# Altium footprint library CONN_HDR_MINI_ST_SMD.PcbLib: 102 footprints (part 2 of 7)
Each footprint in its own frame and in the unit in brackets; x right, y up, seen from the top. Pads: shape width x height; smd on the part's side, far side on the other; paste and mask are expansions set on the pad; w line width, h text height; cw(c..) or ccw(c..) is an arc to the next point about the centre after c.
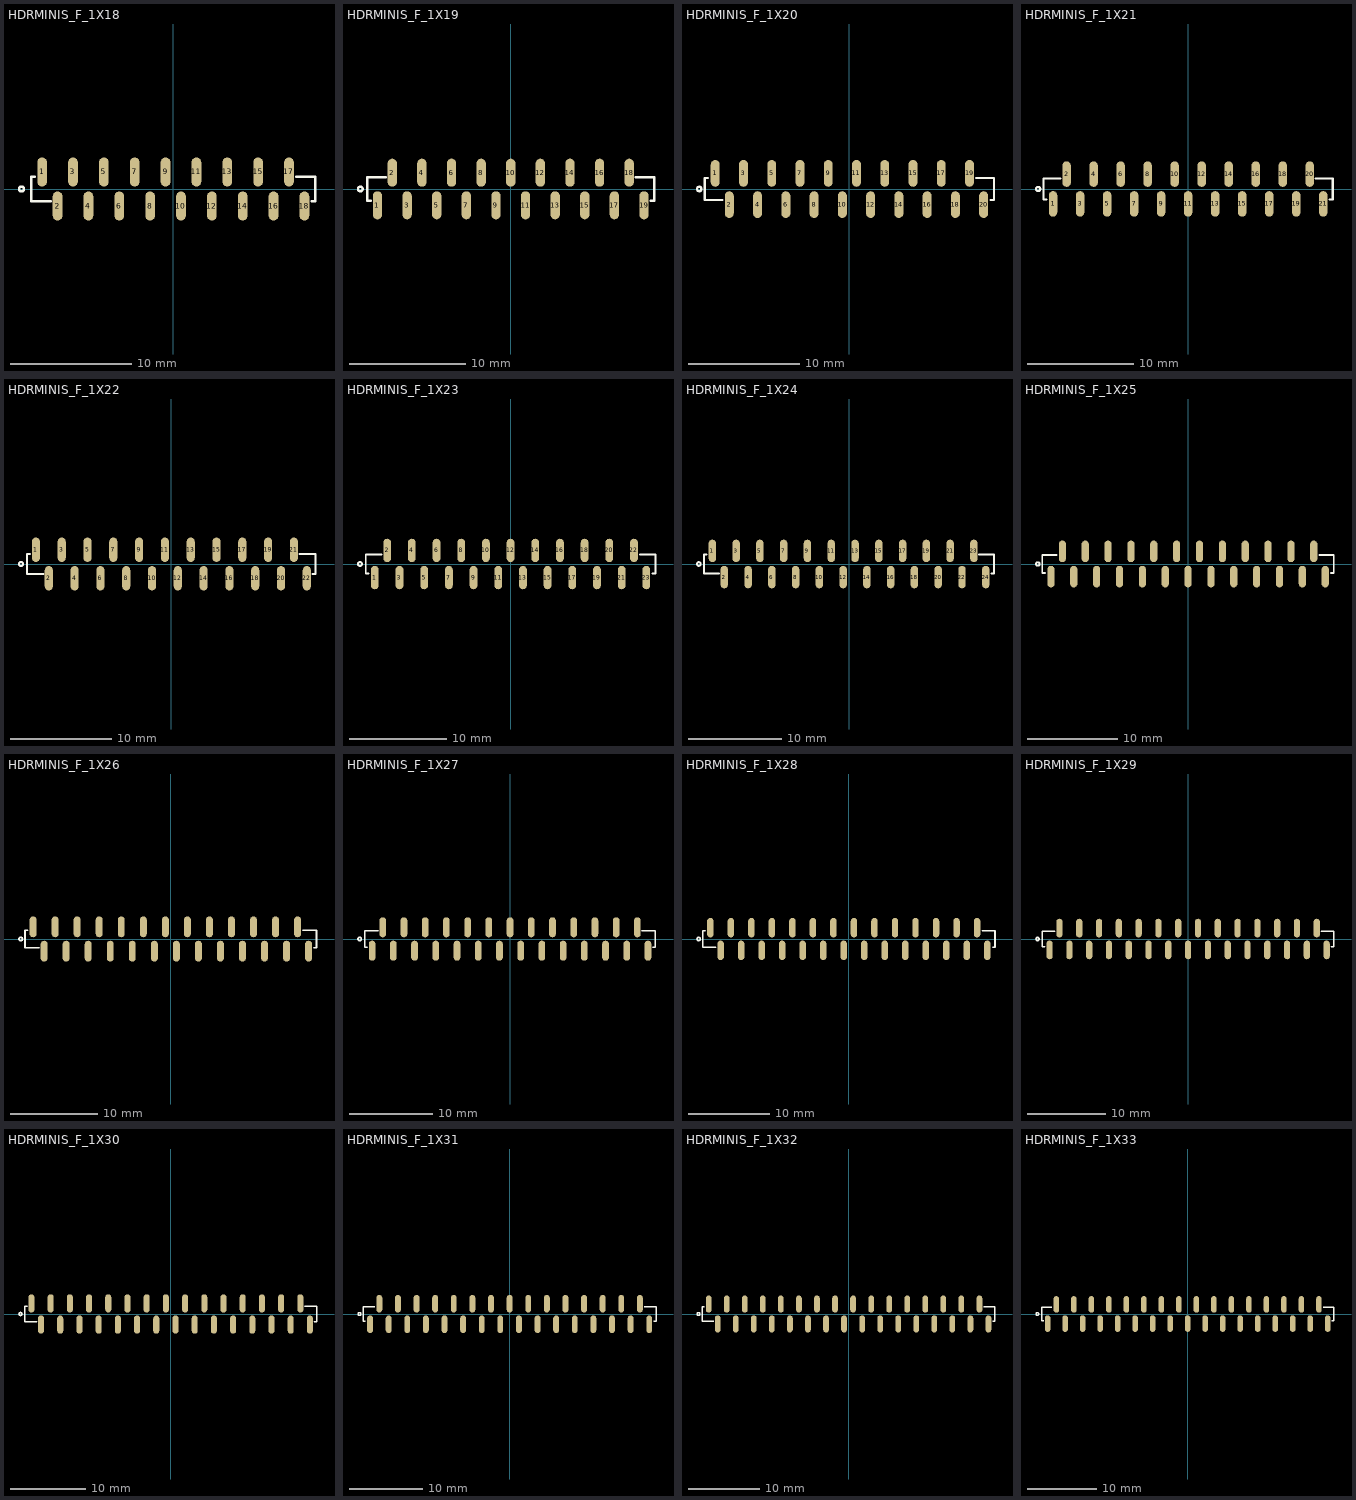
[diagram p1: the footprints below, top view; thin cyan lines are the x and y axes]

## HDRMINIS_F_1X18 [mm] "mini header (50mil pitch)"
pads (18):
  oval 0.8x2.4 smd mask+0.1: 1(-10.795,1.4) 2(-9.525,-1.4) 3(-8.255,1.4) 4(-6.985,-1.4) 5(-5.715,1.4) 6(-4.445,-1.4) 7(-3.175,1.4) 8(-1.905,-1.4) 9(-0.635,1.4) 10(0.635,-1.4) 11(1.905,1.4) 12(3.175,-1.4) 13(4.445,1.4) 14(5.715,-1.4) 15(6.985,1.4) 16(8.255,-1.4) 17(9.525,1.4) 18(10.795,-1.4)
Top Overlay:
  circle w0.2: c-12.5,0 r0.2
  lines w0.2: -11.4,1 -11.7,1 -11.7,-1 -10.1,-1 ; 10.1,1 11.7,1 11.7,-1 11.4,-1
3D body "a-bl127-eg-z02mr1.step": height 4.65, standoff 0.05, extent 3.61,-1.6 6.55,1.6
3D body "a-bl127-eg-z02mr1.step": height 4.65, standoff 0.05, extent 6.15,-1.6 9.09,1.6
3D body "a-bl127-eg-z02mr1.step": height 4.65, standoff 0.05, extent 8.69,-1.6 11.63,1.6
3D body "a-bl127-eg-z02mr1.step": height 4.65, standoff 0.05, extent 1.07,-1.6 4.01,1.6
3D body "a-bl127-eg-z02mr1.step": height 4.65, standoff 0.05, extent -1.47,-1.6 1.47,1.6
3D body "a-bl127-eg-z02mr1.step": height 4.65, standoff 0.05, extent -4.01,-1.6 -1.07,1.6
3D body "a-bl127-eg-z02mr1.step": height 4.65, standoff 0.05, extent -6.55,-1.6 -3.61,1.6
3D body "a-bl127-eg-z02mr1.step": height 4.65, standoff 0.05, extent -9.09,-1.6 -6.15,1.6
3D body "a-bl127-eg-z02mr1.step": height 4.65, standoff 0.05, extent -11.63,-1.6 -8.69,1.6

## HDRMINIS_F_1X19 [mm] "mini header (50mil pitch)"
pads (19):
  oval 0.8x2.4 smd mask+0.1: 1(-11.43,-1.4) 2(-10.16,1.4) 3(-8.89,-1.4) 4(-7.62,1.4) 5(-6.35,-1.4) 6(-5.08,1.4) 7(-3.81,-1.4) 8(-2.54,1.4) 9(-1.27,-1.4) 10(0,1.4) 11(1.27,-1.4) 12(2.54,1.4) 13(3.81,-1.4) 14(5.08,1.4) 15(6.35,-1.4) 16(7.62,1.4) 17(8.89,-1.4) 18(10.16,1.4) 19(11.43,-1.4)
Top Overlay:
  circle w0.2: c-12.9,0 r0.2
  lines w0.2: -12,-1 -12.3,-1 -12.3,1 -10.7,1 ; 10.7,1 12.3,1 12.3,-1 12,-1
3D body "a-bl127-eg-z02mr1.step": height 4.65, standoff 0.05, extent 6.785,-1.6 9.725,1.6
3D body "a-bl127-eg-z02mr1.step": height 4.65, standoff 0.05, extent 9.325,-1.6 12.265,1.6
3D body "a-bl127-eg-z02mr1.step": height 4.65, standoff 0.05, extent 4.245,-1.6 7.185,1.6
3D body "a-bl127-eg-z02mr1.step": height 4.65, standoff 0.05, extent 1.705,-1.6 4.645,1.6
3D body "a-bl127-eg-z02mr1.step": height 4.65, standoff 0.05, extent -0.835,-1.6 2.105,1.6
3D body "a-bl127-eg-z02mr1.step": height 4.65, standoff 0.05, extent -3.375,-1.6 -0.435,1.6
3D body "a-bl127-eg-z02mr1.step": height 4.65, standoff 0.05, extent -5.915,-1.6 -2.975,1.6
3D body "a-bl127-eg-z02mr1.step": height 4.65, standoff 0.05, extent -8.455,-1.6 -5.515,1.6
3D body "a-bl127-eg-z03mr1.stp": height 4.65, standoff 0.05, extent -12.265,-1.6 -8.055,1.6

## HDRMINIS_F_1X20 [mm] "mini header (50mil pitch)"
pads (20):
  oval 0.8x2.4 smd mask+0.1: 1(-12.065,1.4) 2(-10.795,-1.4) 3(-9.525,1.4) 4(-8.255,-1.4) 5(-6.985,1.4) 6(-5.715,-1.4) 7(-4.445,1.4) 8(-3.175,-1.4) 9(-1.905,1.4) 10(-0.635,-1.4) 11(0.635,1.4) 12(1.905,-1.4) 13(3.175,1.4) 14(4.445,-1.4) 15(5.715,1.4) 16(6.985,-1.4) 17(8.255,1.4) 18(9.525,-1.4) 19(10.795,1.4) 20(12.065,-1.4)
Top Overlay:
  circle w0.2: c-13.5,0 r0.2
  lines w0.2: -12.7,1 -13,1 -13,-1 -11.4,-1 ; 11.4,1 13,1 13,-1 12.7,-1
3D body "a-bl127-eg-z02mr1.step": height 4.65, standoff 0.05, extent -12.9,-1.6 -9.96,1.6
3D body "a-bl127-eg-z02mr1.step": height 4.65, standoff 0.05, extent -10.36,-1.6 -7.42,1.6
3D body "a-bl127-eg-z02mr1.step": height 4.65, standoff 0.05, extent -7.82,-1.6 -4.88,1.6
3D body "a-bl127-eg-z02mr1.step": height 4.65, standoff 0.05, extent -5.28,-1.6 -2.34,1.6
3D body "a-bl127-eg-z02mr1.step": height 4.65, standoff 0.05, extent -2.74,-1.6 0.2,1.6
3D body "a-bl127-eg-z02mr1.step": height 4.65, standoff 0.05, extent -0.2,-1.6 2.74,1.6
3D body "a-bl127-eg-z02mr1.step": height 4.65, standoff 0.05, extent 9.96,-1.6 12.9,1.6
3D body "a-bl127-eg-z02mr1.step": height 4.65, standoff 0.05, extent 7.42,-1.6 10.36,1.6
3D body "a-bl127-eg-z02mr1.step": height 4.65, standoff 0.05, extent 4.88,-1.6 7.82,1.6
3D body "a-bl127-eg-z02mr1.step": height 4.65, standoff 0.05, extent 2.34,-1.6 5.28,1.6

## HDRMINIS_F_1X21 [mm] "mini header (50mil pitch)"
pads (21):
  oval 0.8x2.4 smd mask+0.1: 1(-12.7,-1.4) 2(-11.43,1.4) 3(-10.16,-1.4) 4(-8.89,1.4) 5(-7.62,-1.4) 6(-6.35,1.4) 7(-5.08,-1.4) 8(-3.81,1.4) 9(-2.54,-1.4) 10(-1.27,1.4) 11(0,-1.4) 12(1.27,1.4) 13(2.54,-1.4) 14(3.81,1.4) 15(5.08,-1.4) 16(6.35,1.4) 17(7.62,-1.4) 18(8.89,1.4) 19(10.16,-1.4) 20(11.43,1.4) 21(12.7,-1.4)
Top Overlay:
  circle w0.2: c-14.1,0 r0.2
  lines w0.2: -13.3,-1 -13.6,-1 -13.6,1 -12,1 ; 12,1 13.6,1 13.6,-1 13.3,-1
3D body "a-bl127-eg-z03mr1.stp": height 4.65, standoff 0.05, extent -13.535,-1.6 -9.325,1.6
3D body "a-bl127-eg-z02mr1.step": height 4.65, standoff 0.05, extent -9.725,-1.6 -6.785,1.6
3D body "a-bl127-eg-z02mr1.step": height 4.65, standoff 0.05, extent -7.185,-1.6 -4.245,1.6
3D body "a-bl127-eg-z02mr1.step": height 4.65, standoff 0.05, extent -4.645,-1.6 -1.705,1.6
3D body "a-bl127-eg-z02mr1.step": height 4.65, standoff 0.05, extent -2.105,-1.6 0.835,1.6
3D body "a-bl127-eg-z02mr1.step": height 4.65, standoff 0.05, extent 0.435,-1.6 3.375,1.6
3D body "a-bl127-eg-z02mr1.step": height 4.65, standoff 0.05, extent 2.975,-1.6 5.915,1.6
3D body "a-bl127-eg-z02mr1.step": height 4.65, standoff 0.05, extent 10.595,-1.6 13.535,1.6
3D body "a-bl127-eg-z02mr1.step": height 4.65, standoff 0.05, extent 8.055,-1.6 10.995,1.6
3D body "a-bl127-eg-z02mr1.step": height 4.65, standoff 0.05, extent 5.515,-1.6 8.455,1.6

## HDRMINIS_F_1X22 [mm] "mini header (50mil pitch)"
pads (22):
  oval 0.8x2.4 smd mask+0.1: 1(-13.335,1.4) 2(-12.065,-1.4) 3(-10.795,1.4) 4(-9.525,-1.4) 5(-8.255,1.4) 6(-6.985,-1.4) 7(-5.715,1.4) 8(-4.445,-1.4) 9(-3.175,1.4) 10(-1.905,-1.4) 11(-0.635,1.4) 12(0.635,-1.4) 13(1.905,1.4) 14(3.175,-1.4) 15(4.445,1.4) 16(5.715,-1.4) 17(6.985,1.4) 18(8.255,-1.4) 19(9.525,1.4) 20(10.795,-1.4) 21(12.065,1.4) 22(13.335,-1.4)
Top Overlay:
  circle w0.2: c-14.8,0 r0.2
  lines w0.2: -13.9,1 -14.2,1 -14.2,-1 -12.6,-1 ; 12.6,1 14.2,1 14.2,-1 13.9,-1
3D body "a-bl127-eg-z02mr1.step": height 4.65, standoff 0.05, extent -14.17,-1.6 -11.23,1.6
3D body "a-bl127-eg-z02mr1.step": height 4.65, standoff 0.05, extent -11.63,-1.6 -8.69,1.6
3D body "a-bl127-eg-z02mr1.step": height 4.65, standoff 0.05, extent -9.09,-1.6 -6.15,1.6
3D body "a-bl127-eg-z02mr1.step": height 4.65, standoff 0.05, extent -6.55,-1.6 -3.61,1.6
3D body "a-bl127-eg-z02mr1.step": height 4.65, standoff 0.05, extent -4.01,-1.6 -1.07,1.6
3D body "a-bl127-eg-z02mr1.step": height 4.65, standoff 0.05, extent -1.47,-1.6 1.47,1.6
3D body "a-bl127-eg-z02mr1.step": height 4.65, standoff 0.05, extent 8.69,-1.6 11.63,1.6
3D body "a-bl127-eg-z02mr1.step": height 4.65, standoff 0.05, extent 6.15,-1.6 9.09,1.6
3D body "a-bl127-eg-z02mr1.step": height 4.65, standoff 0.05, extent 3.61,-1.6 6.55,1.6
3D body "a-bl127-eg-z02mr1.step": height 4.65, standoff 0.05, extent 1.07,-1.6 4.01,1.6
3D body "a-bl127-eg-z02mr1.step": height 4.65, standoff 0.05, extent 11.23,-1.6 14.17,1.6

## HDRMINIS_F_1X23 [mm] "mini header (50mil pitch)"
pads (23):
  oval 0.8x2.4 smd mask+0.1: 1(-13.97,-1.4) 2(-12.7,1.4) 3(-11.43,-1.4) 4(-10.16,1.4) 5(-8.89,-1.4) 6(-7.62,1.4) 7(-6.35,-1.4) 8(-5.08,1.4) 9(-3.81,-1.4) 10(-2.54,1.4) 11(-1.27,-1.4) 12(0,1.4) 13(1.27,-1.4) 14(2.54,1.4) 15(3.81,-1.4) 16(5.08,1.4) 17(6.35,-1.4) 18(7.62,1.4) 19(8.89,-1.4) 20(10.16,1.4) 21(11.43,-1.4) 22(12.7,1.4) 23(13.97,-1.4)
Top Overlay:
  circle w0.2: c-15.5,0 r0.2
  lines w0.2: -14.6,-1 -14.9,-1 -14.9,1 -13.3,1 ; 13.3,1 14.9,1 14.9,-1 14.6,-1
3D body "a-bl127-eg-z03mr1.stp": height 4.65, standoff 0.05, extent -14.805,-1.6 -10.595,1.6
3D body "a-bl127-eg-z02mr1.step": height 4.65, standoff 0.05, extent -10.995,-1.6 -8.055,1.6
3D body "a-bl127-eg-z02mr1.step": height 4.65, standoff 0.05, extent -8.455,-1.6 -5.515,1.6
3D body "a-bl127-eg-z02mr1.step": height 4.65, standoff 0.05, extent -5.915,-1.6 -2.975,1.6
3D body "a-bl127-eg-z02mr1.step": height 4.65, standoff 0.05, extent -3.375,-1.6 -0.435,1.6
3D body "a-bl127-eg-z02mr1.step": height 4.65, standoff 0.05, extent -0.835,-1.6 2.105,1.6
3D body "a-bl127-eg-z02mr1.step": height 4.65, standoff 0.05, extent 1.705,-1.6 4.645,1.6
3D body "a-bl127-eg-z02mr1.step": height 4.65, standoff 0.05, extent 11.865,-1.6 14.805,1.6
3D body "a-bl127-eg-z02mr1.step": height 4.65, standoff 0.05, extent 9.325,-1.6 12.265,1.6
3D body "a-bl127-eg-z02mr1.step": height 4.65, standoff 0.05, extent 6.785,-1.6 9.725,1.6
3D body "a-bl127-eg-z02mr1.step": height 4.65, standoff 0.05, extent 4.245,-1.6 7.185,1.6

## HDRMINIS_F_1X24 [mm] "mini header (50mil pitch)"
pads (24):
  oval 0.8x2.4 smd mask+0.1: 1(-14.605,1.4) 2(-13.335,-1.4) 3(-12.065,1.4) 4(-10.795,-1.4) 5(-9.525,1.4) 6(-8.255,-1.4) 7(-6.985,1.4) 8(-5.715,-1.4) 9(-4.445,1.4) 10(-3.175,-1.4) 11(-1.905,1.4) 12(-0.635,-1.4) 13(0.635,1.4) 14(1.905,-1.4) 15(3.175,1.4) 16(4.445,-1.4) 17(5.715,1.4) 18(6.985,-1.4) 19(8.255,1.4) 20(9.525,-1.4) 21(10.795,1.4) 22(12.065,-1.4) 23(13.335,1.4) 24(14.605,-1.4)
Top Overlay:
  circle w0.2: c-16.048,0 r0.2
  lines w0.2: -15.2,1 -15.5,1 -15.5,-1 -13.9,-1 ; 13.9,1 15.5,1 15.5,-1 15.2,-1
3D body "a-bl127-eg-z02mr1.step": height 4.65, standoff 0.05, extent 9.96,-1.6 12.9,1.6
3D body "a-bl127-eg-z02mr1.step": height 4.65, standoff 0.05, extent 12.5,-1.6 15.44,1.6
3D body "a-bl127-eg-z02mr1.step": height 4.65, standoff 0.05, extent -0.2,-1.6 2.74,1.6
3D body "a-bl127-eg-z02mr1.step": height 4.65, standoff 0.05, extent 2.34,-1.6 5.28,1.6
3D body "a-bl127-eg-z02mr1.step": height 4.65, standoff 0.05, extent 4.88,-1.6 7.82,1.6
3D body "a-bl127-eg-z02mr1.step": height 4.65, standoff 0.05, extent 7.42,-1.6 10.36,1.6
3D body "a-bl127-eg-z02mr1.step": height 4.65, standoff 0.05, extent -2.74,-1.6 0.2,1.6
3D body "a-bl127-eg-z02mr1.step": height 4.65, standoff 0.05, extent -5.28,-1.6 -2.34,1.6
3D body "a-bl127-eg-z02mr1.step": height 4.65, standoff 0.05, extent -7.82,-1.6 -4.88,1.6
3D body "a-bl127-eg-z02mr1.step": height 4.65, standoff 0.05, extent -10.36,-1.6 -7.42,1.6
3D body "a-bl127-eg-z02mr1.step": height 4.65, standoff 0.05, extent -12.9,-1.6 -9.96,1.6
3D body "a-bl127-eg-z02mr1.step": height 4.65, standoff 0.05, extent -15.44,-1.6 -12.5,1.6

## HDRMINIS_F_1X25 [mm] "mini header (50mil pitch)"
pads (25):
  oval 0.8x2.4 smd mask+0.1: 1(-15.24,-1.4) 2(-13.97,1.4) 3(-12.7,-1.4) 4(-11.43,1.4) 5(-10.16,-1.4) 6(-8.89,1.4) 7(-7.62,-1.4) 8(-6.35,1.4) 9(-5.08,-1.4) 10(-3.81,1.4) 11(-2.54,-1.4) 12(-1.27,1.4) 13(0,-1.4) 14(1.27,1.4) 15(2.54,-1.4) 16(3.81,1.4) 17(5.08,-1.4) 18(6.35,1.4) 19(7.62,-1.4) 20(8.89,1.4) 21(10.16,-1.4) 22(11.43,1.4) 23(12.7,-1.4) 24(13.97,1.4) 25(15.24,-1.4)
Top Overlay:
  circle w0.2: c-16.7,0 r0.2
  lines w0.2: -15.9,-1 -16.2,-1 -16.2,1 -14.6,1 ; 14.6,1 16.2,1 16.2,-1 15.9,-1
3D body "a-bl127-eg-z03mr1.stp": height 4.65, standoff 0.05, extent -16.075,-1.6 -11.865,1.6
3D body "a-bl127-eg-z02mr1.step": height 4.65, standoff 0.05, extent -12.265,-1.6 -9.325,1.6
3D body "a-bl127-eg-z02mr1.step": height 4.65, standoff 0.05, extent -9.725,-1.6 -6.785,1.6
3D body "a-bl127-eg-z02mr1.step": height 4.65, standoff 0.05, extent -7.185,-1.6 -4.245,1.6
3D body "a-bl127-eg-z02mr1.step": height 4.65, standoff 0.05, extent -4.645,-1.6 -1.705,1.6
3D body "a-bl127-eg-z02mr1.step": height 4.65, standoff 0.05, extent -2.105,-1.6 0.835,1.6
3D body "a-bl127-eg-z02mr1.step": height 4.65, standoff 0.05, extent 0.435,-1.6 3.375,1.6
3D body "a-bl127-eg-z02mr1.step": height 4.65, standoff 0.05, extent 10.595,-1.6 13.535,1.6
3D body "a-bl127-eg-z02mr1.step": height 4.65, standoff 0.05, extent 8.055,-1.6 10.995,1.6
3D body "a-bl127-eg-z02mr1.step": height 4.65, standoff 0.05, extent 5.515,-1.6 8.455,1.6
3D body "a-bl127-eg-z02mr1.step": height 4.65, standoff 0.05, extent 2.975,-1.6 5.915,1.6
3D body "a-bl127-eg-z02mr1.step": height 4.65, standoff 0.05, extent 13.135,-1.6 16.075,1.6

## HDRMINIS_F_1X26 [mm] "mini header (50mil pitch)"
pads (26):
  oval 0.8x2.4 smd mask+0.1: 1(-15.875,1.4) 2(-14.605,-1.4) 3(-13.335,1.4) 4(-12.065,-1.4) 5(-10.795,1.4) 6(-9.525,-1.4) 7(-8.255,1.4) 8(-6.985,-1.4) 9(-5.715,1.4) 10(-4.445,-1.4) 11(-3.175,1.4) 12(-1.905,-1.4) 13(-0.635,1.4) 14(0.635,-1.4) 15(1.905,1.4) 16(3.175,-1.4) 17(4.445,1.4) 18(5.715,-1.4) 19(6.985,1.4) 20(8.255,-1.4) 21(9.525,1.4) 22(10.795,-1.4) 23(12.065,1.4) 24(13.335,-1.4) 25(14.605,1.4) 26(15.875,-1.4)
Top Overlay:
  circle w0.2: c-17.3,0 r0.2
  lines w0.2: -16.5,1 -16.8,1 -16.8,-1 -15.2,-1 ; 15.2,1 16.8,1 16.8,-1 16.5,-1
3D body "a-bl127-eg-z02mr1.step": height 4.65, standoff 0.05, extent 8.69,-1.6 11.63,1.6
3D body "a-bl127-eg-z02mr1.step": height 4.65, standoff 0.05, extent 11.23,-1.6 14.17,1.6
3D body "a-bl127-eg-z02mr1.step": height 4.65, standoff 0.05, extent 13.77,-1.6 16.71,1.6
3D body "a-bl127-eg-z02mr1.step": height 4.65, standoff 0.05, extent -1.47,-1.6 1.47,1.6
3D body "a-bl127-eg-z02mr1.step": height 4.65, standoff 0.05, extent 1.07,-1.6 4.01,1.6
3D body "a-bl127-eg-z02mr1.step": height 4.65, standoff 0.05, extent 3.61,-1.6 6.55,1.6
3D body "a-bl127-eg-z02mr1.step": height 4.65, standoff 0.05, extent 6.15,-1.6 9.09,1.6
3D body "a-bl127-eg-z02mr1.step": height 4.65, standoff 0.05, extent -4.01,-1.6 -1.07,1.6
3D body "a-bl127-eg-z02mr1.step": height 4.65, standoff 0.05, extent -6.55,-1.6 -3.61,1.6
3D body "a-bl127-eg-z02mr1.step": height 4.65, standoff 0.05, extent -9.09,-1.6 -6.15,1.6
3D body "a-bl127-eg-z02mr1.step": height 4.65, standoff 0.05, extent -11.63,-1.6 -8.69,1.6
3D body "a-bl127-eg-z02mr1.step": height 4.65, standoff 0.05, extent -14.17,-1.6 -11.23,1.6
3D body "a-bl127-eg-z02mr1.step": height 4.65, standoff 0.05, extent -16.71,-1.6 -13.77,1.6

## HDRMINIS_F_1X27 [mm] "mini header (50mil pitch)"
pads (27):
  oval 0.8x2.4 smd mask+0.1: 1(-16.51,-1.4) 2(-15.24,1.4) 3(-13.97,-1.4) 4(-12.7,1.4) 5(-11.43,-1.4) 6(-10.16,1.4) 7(-8.89,-1.4) 8(-7.62,1.4) 9(-6.35,-1.4) 10(-5.08,1.4) 11(-3.81,-1.4) 12(-2.54,1.4) 13(-1.27,-1.4) 14(0,1.4) 15(1.27,-1.4) 16(2.54,1.4) 17(3.81,-1.4) 18(5.08,1.4) 19(6.35,-1.4) 20(7.62,1.4) 21(8.89,-1.4) 22(10.16,1.4) 23(11.43,-1.4) 24(12.7,1.4) 25(13.97,-1.4) 26(15.24,1.4) 27(16.51,-1.4)
Top Overlay:
  circle w0.2: c-18,0 r0.2
  lines w0.2: -17.1,-1 -17.4,-1 -17.4,1 -15.8,1 ; 15.8,1 17.4,1 17.4,-1 17.1,-1
3D body "a-bl127-eg-z02mr1.step": height 4.65, standoff 0.05, extent 11.865,-1.6 14.805,1.6
3D body "a-bl127-eg-z02mr1.step": height 4.65, standoff 0.05, extent 14.405,-1.6 17.345,1.6
3D body "a-bl127-eg-z02mr1.step": height 4.65, standoff 0.05, extent 1.705,-1.6 4.645,1.6
3D body "a-bl127-eg-z02mr1.step": height 4.65, standoff 0.05, extent 4.245,-1.6 7.185,1.6
3D body "a-bl127-eg-z02mr1.step": height 4.65, standoff 0.05, extent 6.785,-1.6 9.725,1.6
3D body "a-bl127-eg-z02mr1.step": height 4.65, standoff 0.05, extent 9.325,-1.6 12.265,1.6
3D body "a-bl127-eg-z02mr1.step": height 4.65, standoff 0.05, extent -0.835,-1.6 2.105,1.6
3D body "a-bl127-eg-z02mr1.step": height 4.65, standoff 0.05, extent -3.375,-1.6 -0.435,1.6
3D body "a-bl127-eg-z02mr1.step": height 4.65, standoff 0.05, extent -5.915,-1.6 -2.975,1.6
3D body "a-bl127-eg-z02mr1.step": height 4.65, standoff 0.05, extent -8.455,-1.6 -5.515,1.6
3D body "a-bl127-eg-z02mr1.step": height 4.65, standoff 0.05, extent -10.995,-1.6 -8.055,1.6
3D body "a-bl127-eg-z02mr1.step": height 4.65, standoff 0.05, extent -13.535,-1.6 -10.595,1.6
3D body "a-bl127-eg-z03mr1.stp": height 4.65, standoff 0.05, extent -17.345,-1.6 -13.135,1.6

## HDRMINIS_F_1X28 [mm] "mini header (50mil pitch)"
pads (28):
  oval 0.8x2.4 smd mask+0.1: 1(-17.145,1.4) 2(-15.875,-1.4) 3(-14.605,1.4) 4(-13.335,-1.4) 5(-12.065,1.4) 6(-10.795,-1.4) 7(-9.525,1.4) 8(-8.255,-1.4) 9(-6.985,1.4) 10(-5.715,-1.4) 11(-4.445,1.4) 12(-3.175,-1.4) 13(-1.905,1.4) 14(-0.635,-1.4) 15(0.635,1.4) 16(1.905,-1.4) 17(3.175,1.4) 18(4.445,-1.4) 19(5.715,1.4) 20(6.985,-1.4) 21(8.255,1.4) 22(9.525,-1.4) 23(10.795,1.4) 24(12.065,-1.4) 25(13.335,1.4) 26(14.605,-1.4) 27(15.875,1.4) 28(17.145,-1.4)
Top Overlay:
  circle w0.2: c-18.6,0 r0.2
  lines w0.2: -17.8,1 -18.1,1 -18.1,-1 -16.5,-1 ; 16.5,1 18.1,1 18.1,-1 17.8,-1
3D body "a-bl127-eg-z02mr1.step": height 4.65, standoff 0.05, extent -17.98,-1.6 -15.04,1.6
3D body "a-bl127-eg-z02mr1.step": height 4.65, standoff 0.05, extent -15.44,-1.6 -12.5,1.6
3D body "a-bl127-eg-z02mr1.step": height 4.65, standoff 0.05, extent -12.9,-1.6 -9.96,1.6
3D body "a-bl127-eg-z02mr1.step": height 4.65, standoff 0.05, extent -10.36,-1.6 -7.42,1.6
3D body "a-bl127-eg-z02mr1.step": height 4.65, standoff 0.05, extent -7.82,-1.6 -4.88,1.6
3D body "a-bl127-eg-z02mr1.step": height 4.65, standoff 0.05, extent -5.28,-1.6 -2.34,1.6
3D body "a-bl127-eg-z02mr1.step": height 4.65, standoff 0.05, extent 4.88,-1.6 7.82,1.6
3D body "a-bl127-eg-z02mr1.step": height 4.65, standoff 0.05, extent 2.34,-1.6 5.28,1.6
3D body "a-bl127-eg-z02mr1.step": height 4.65, standoff 0.05, extent -0.2,-1.6 2.74,1.6
3D body "a-bl127-eg-z02mr1.step": height 4.65, standoff 0.05, extent -2.74,-1.6 0.2,1.6
3D body "a-bl127-eg-z02mr1.step": height 4.65, standoff 0.05, extent 15.04,-1.6 17.98,1.6
3D body "a-bl127-eg-z02mr1.step": height 4.65, standoff 0.05, extent 12.5,-1.6 15.44,1.6
3D body "a-bl127-eg-z02mr1.step": height 4.65, standoff 0.05, extent 9.96,-1.6 12.9,1.6
3D body "a-bl127-eg-z02mr1.step": height 4.65, standoff 0.05, extent 7.42,-1.6 10.36,1.6

## HDRMINIS_F_1X29 [mm] "mini header (50mil pitch)"
pads (29):
  oval 0.8x2.4 smd mask+0.1: 1(-17.78,-1.4) 2(-16.51,1.4) 3(-15.24,-1.4) 4(-13.97,1.4) 5(-12.7,-1.4) 6(-11.43,1.4) 7(-10.16,-1.4) 8(-8.89,1.4) 9(-7.62,-1.4) 10(-6.35,1.4) 11(-5.08,-1.4) 12(-3.81,1.4) 13(-2.54,-1.4) 14(-1.27,1.4) 15(0,-1.4) 16(1.27,1.4) 17(2.54,-1.4) 18(3.81,1.4) 19(5.08,-1.4) 20(6.35,1.4) 21(7.62,-1.4) 22(8.89,1.4) 23(10.16,-1.4) 24(11.43,1.4) 25(12.7,-1.4) 26(13.97,1.4) 27(15.24,-1.4) 28(16.51,1.4) 29(17.78,-1.4)
Top Overlay:
  circle w0.2: c-19.323,0 r0.2
  lines w0.2: -18.4,-1 -18.7,-1 -18.7,1 -17.1,1 ; 17.1,1 18.7,1 18.7,-1 18.4,-1
3D body "a-bl127-eg-z03mr1.stp": height 4.65, standoff 0.05, extent -18.615,-1.6 -14.405,1.6
3D body "a-bl127-eg-z02mr1.step": height 4.65, standoff 0.05, extent -14.805,-1.6 -11.865,1.6
3D body "a-bl127-eg-z02mr1.step": height 4.65, standoff 0.05, extent -12.265,-1.6 -9.325,1.6
3D body "a-bl127-eg-z02mr1.step": height 4.65, standoff 0.05, extent -9.725,-1.6 -6.785,1.6
3D body "a-bl127-eg-z02mr1.step": height 4.65, standoff 0.05, extent -7.185,-1.6 -4.245,1.6
3D body "a-bl127-eg-z02mr1.step": height 4.65, standoff 0.05, extent -4.645,-1.6 -1.705,1.6
3D body "a-bl127-eg-z02mr1.step": height 4.65, standoff 0.05, extent -2.105,-1.6 0.835,1.6
3D body "a-bl127-eg-z02mr1.step": height 4.65, standoff 0.05, extent 8.055,-1.6 10.995,1.6
3D body "a-bl127-eg-z02mr1.step": height 4.65, standoff 0.05, extent 5.515,-1.6 8.455,1.6
3D body "a-bl127-eg-z02mr1.step": height 4.65, standoff 0.05, extent 2.975,-1.6 5.915,1.6
3D body "a-bl127-eg-z02mr1.step": height 4.65, standoff 0.05, extent 0.435,-1.6 3.375,1.6
3D body "a-bl127-eg-z02mr1.step": height 4.65, standoff 0.05, extent 15.675,-1.6 18.615,1.6
3D body "a-bl127-eg-z02mr1.step": height 4.65, standoff 0.05, extent 13.135,-1.6 16.075,1.6
3D body "a-bl127-eg-z02mr1.step": height 4.65, standoff 0.05, extent 10.595,-1.6 13.535,1.6

## HDRMINIS_F_1X30 [mm] "mini header (50mil pitch)"
pads (30):
  oval 0.8x2.4 smd mask+0.1: 1(-18.415,1.4) 2(-17.145,-1.4) 3(-15.875,1.4) 4(-14.605,-1.4) 5(-13.335,1.4) 6(-12.065,-1.4) 7(-10.795,1.4) 8(-9.525,-1.4) 9(-8.255,1.4) 10(-6.985,-1.4) 11(-5.715,1.4) 12(-4.445,-1.4) 13(-3.175,1.4) 14(-1.905,-1.4) 15(-0.635,1.4) 16(0.635,-1.4) 17(1.905,1.4) 18(3.175,-1.4) 19(4.445,1.4) 20(5.715,-1.4) 21(6.985,1.4) 22(8.255,-1.4) 23(9.525,1.4) 24(10.795,-1.4) 25(12.065,1.4) 26(13.335,-1.4) 27(14.605,1.4) 28(15.875,-1.4) 29(17.145,1.4) 30(18.415,-1.4)
Top Overlay:
  circle w0.2: c-19.858,0 r0.2
  lines w0.2: -19,1 -19.3,1 -19.3,-1 -17.7,-1 ; 17.7,1 19.3,1 19.3,-1 19,-1
3D body "a-bl127-eg-z02mr1.step": height 4.65, standoff 0.05, extent 6.15,-1.6 9.09,1.6
3D body "a-bl127-eg-z02mr1.step": height 4.65, standoff 0.05, extent 8.69,-1.6 11.63,1.6
3D body "a-bl127-eg-z02mr1.step": height 4.65, standoff 0.05, extent 11.23,-1.6 14.17,1.6
3D body "a-bl127-eg-z02mr1.step": height 4.65, standoff 0.05, extent 13.77,-1.6 16.71,1.6
3D body "a-bl127-eg-z02mr1.step": height 4.65, standoff 0.05, extent 16.31,-1.6 19.25,1.6
3D body "a-bl127-eg-z02mr1.step": height 4.65, standoff 0.05, extent -4.01,-1.6 -1.07,1.6
3D body "a-bl127-eg-z02mr1.step": height 4.65, standoff 0.05, extent -1.47,-1.6 1.47,1.6
3D body "a-bl127-eg-z02mr1.step": height 4.65, standoff 0.05, extent 1.07,-1.6 4.01,1.6
3D body "a-bl127-eg-z02mr1.step": height 4.65, standoff 0.05, extent 3.61,-1.6 6.55,1.6
3D body "a-bl127-eg-z02mr1.step": height 4.65, standoff 0.05, extent -6.55,-1.6 -3.61,1.6
3D body "a-bl127-eg-z02mr1.step": height 4.65, standoff 0.05, extent -9.09,-1.6 -6.15,1.6
3D body "a-bl127-eg-z02mr1.step": height 4.65, standoff 0.05, extent -11.63,-1.6 -8.69,1.6
3D body "a-bl127-eg-z02mr1.step": height 4.65, standoff 0.05, extent -14.17,-1.6 -11.23,1.6
3D body "a-bl127-eg-z02mr1.step": height 4.65, standoff 0.05, extent -16.71,-1.6 -13.77,1.6
3D body "a-bl127-eg-z02mr1.step": height 4.65, standoff 0.05, extent -19.25,-1.6 -16.31,1.6

## HDRMINIS_F_1X31 [mm] "mini header (50mil pitch)"
pads (31):
  oval 0.8x2.4 smd mask+0.1: 1(-19.05,-1.4) 2(-17.78,1.4) 3(-16.51,-1.4) 4(-15.24,1.4) 5(-13.97,-1.4) 6(-12.7,1.4) 7(-11.43,-1.4) 8(-10.16,1.4) 9(-8.89,-1.4) 10(-7.62,1.4) 11(-6.35,-1.4) 12(-5.08,1.4) 13(-3.81,-1.4) 14(-2.54,1.4) 15(-1.27,-1.4) 16(0,1.4) 17(1.27,-1.4) 18(2.54,1.4) 19(3.81,-1.4) 20(5.08,1.4) 21(6.35,-1.4) 22(7.62,1.4) 23(8.89,-1.4) 24(10.16,1.4) 25(11.43,-1.4) 26(12.7,1.4) 27(13.97,-1.4) 28(15.24,1.4) 29(16.51,-1.4) 30(17.78,1.4) 31(19.05,-1.4)
Top Overlay:
  circle w0.2: c-20.493,0 r0.2
  lines w0.2: -19.7,-1 -20,-1 -20,1 -18.4,1 ; 18.4,1 20,1 20,-1 19.7,-1
3D body "a-bl127-eg-z03mr1.stp": height 4.65, standoff 0.05, extent -19.885,-1.6 -15.675,1.6
3D body "a-bl127-eg-z02mr1.step": height 4.65, standoff 0.05, extent -16.075,-1.6 -13.135,1.6
3D body "a-bl127-eg-z02mr1.step": height 4.65, standoff 0.05, extent -13.535,-1.6 -10.595,1.6
3D body "a-bl127-eg-z02mr1.step": height 4.65, standoff 0.05, extent -10.995,-1.6 -8.055,1.6
3D body "a-bl127-eg-z02mr1.step": height 4.65, standoff 0.05, extent -8.455,-1.6 -5.515,1.6
3D body "a-bl127-eg-z02mr1.step": height 4.65, standoff 0.05, extent -5.915,-1.6 -2.975,1.6
3D body "a-bl127-eg-z02mr1.step": height 4.65, standoff 0.05, extent -3.375,-1.6 -0.435,1.6
3D body "a-bl127-eg-z02mr1.step": height 4.65, standoff 0.05, extent 6.785,-1.6 9.725,1.6
3D body "a-bl127-eg-z02mr1.step": height 4.65, standoff 0.05, extent 4.245,-1.6 7.185,1.6
3D body "a-bl127-eg-z02mr1.step": height 4.65, standoff 0.05, extent 1.705,-1.6 4.645,1.6
3D body "a-bl127-eg-z02mr1.step": height 4.65, standoff 0.05, extent -0.835,-1.6 2.105,1.6
3D body "a-bl127-eg-z02mr1.step": height 4.65, standoff 0.05, extent 16.945,-1.6 19.885,1.6
3D body "a-bl127-eg-z02mr1.step": height 4.65, standoff 0.05, extent 14.405,-1.6 17.345,1.6
3D body "a-bl127-eg-z02mr1.step": height 4.65, standoff 0.05, extent 11.865,-1.6 14.805,1.6
3D body "a-bl127-eg-z02mr1.step": height 4.65, standoff 0.05, extent 9.325,-1.6 12.265,1.6

## HDRMINIS_F_1X32 [mm] "mini header (50mil pitch)"
pads (32):
  oval 0.8x2.4 smd mask+0.1: 1(-19.685,1.4) 2(-18.415,-1.4) 3(-17.145,1.4) 4(-15.875,-1.4) 5(-14.605,1.4) 6(-13.335,-1.4) 7(-12.065,1.4) 8(-10.795,-1.4) 9(-9.525,1.4) 10(-8.255,-1.4) 11(-6.985,1.4) 12(-5.715,-1.4) 13(-4.445,1.4) 14(-3.175,-1.4) 15(-1.905,1.4) 16(-0.635,-1.4) 17(0.635,1.4) 18(1.905,-1.4) 19(3.175,1.4) 20(4.445,-1.4) 21(5.715,1.4) 22(6.985,-1.4) 23(8.255,1.4) 24(9.525,-1.4) 25(10.795,1.4) 26(12.065,-1.4) 27(13.335,1.4) 28(14.605,-1.4) 29(15.875,1.4) 30(17.145,-1.4) 31(18.415,1.4) 32(19.685,-1.4)
Top Overlay:
  circle w0.2: c-21.128,0 r0.2
  lines w0.2: -20.3,1 -20.6,1 -20.6,-1 -19,-1 ; 19,1 20.6,1 20.6,-1 20.3,-1
3D body "a-bl127-eg-z02mr1.step": height 4.65, standoff 0.05, extent -20.52,-1.6 -17.58,1.6
3D body "a-bl127-eg-z02mr1.step": height 4.65, standoff 0.05, extent -17.98,-1.6 -15.04,1.6
3D body "a-bl127-eg-z02mr1.step": height 4.65, standoff 0.05, extent -15.44,-1.6 -12.5,1.6
3D body "a-bl127-eg-z02mr1.step": height 4.65, standoff 0.05, extent -12.9,-1.6 -9.96,1.6
3D body "a-bl127-eg-z02mr1.step": height 4.65, standoff 0.05, extent -10.36,-1.6 -7.42,1.6
3D body "a-bl127-eg-z02mr1.step": height 4.65, standoff 0.05, extent -7.82,-1.6 -4.88,1.6
3D body "a-bl127-eg-z02mr1.step": height 4.65, standoff 0.05, extent 2.34,-1.6 5.28,1.6
3D body "a-bl127-eg-z02mr1.step": height 4.65, standoff 0.05, extent -0.2,-1.6 2.74,1.6
3D body "a-bl127-eg-z02mr1.step": height 4.65, standoff 0.05, extent -2.74,-1.6 0.2,1.6
3D body "a-bl127-eg-z02mr1.step": height 4.65, standoff 0.05, extent -5.28,-1.6 -2.34,1.6
3D body "a-bl127-eg-z02mr1.step": height 4.65, standoff 0.05, extent 17.58,-1.6 20.52,1.6
3D body "a-bl127-eg-z02mr1.step": height 4.65, standoff 0.05, extent 15.04,-1.6 17.98,1.6
3D body "a-bl127-eg-z02mr1.step": height 4.65, standoff 0.05, extent 12.5,-1.6 15.44,1.6
3D body "a-bl127-eg-z02mr1.step": height 4.65, standoff 0.05, extent 9.96,-1.6 12.9,1.6
3D body "a-bl127-eg-z02mr1.step": height 4.65, standoff 0.05, extent 7.42,-1.6 10.36,1.6
3D body "a-bl127-eg-z02mr1.step": height 4.65, standoff 0.05, extent 4.88,-1.6 7.82,1.6

## HDRMINIS_F_1X33 [mm] "mini header (50mil pitch)"
pads (33):
  oval 0.8x2.4 smd mask+0.1: 1(-20.32,-1.4) 2(-19.05,1.4) 3(-17.78,-1.4) 4(-16.51,1.4) 5(-15.24,-1.4) 6(-13.97,1.4) 7(-12.7,-1.4) 8(-11.43,1.4) 9(-10.16,-1.4) 10(-8.89,1.4) 11(-7.62,-1.4) 12(-6.35,1.4) 13(-5.08,-1.4) 14(-3.81,1.4) 15(-2.54,-1.4) 16(-1.27,1.4) 17(0,-1.4) 18(1.27,1.4) 19(2.54,-1.4) 20(3.81,1.4) 21(5.08,-1.4) 22(6.35,1.4) 23(7.62,-1.4) 24(8.89,1.4) 25(10.16,-1.4) 26(11.43,1.4) 27(12.7,-1.4) 28(13.97,1.4) 29(15.24,-1.4) 30(16.51,1.4) 31(17.78,-1.4) 32(19.05,1.4) 33(20.32,-1.4)
Top Overlay:
  circle w0.2: c-21.8,0 r0.2
  lines w0.2: -20.9,-1 -21.2,-1 -21.2,1 -19.7,1 ; 19.7,1 21.2,1 21.2,-1 20.9,-1
3D body "a-bl127-eg-z02mr1.step": height 4.65, standoff 0.05, extent 8.055,-1.6 10.995,1.6
3D body "a-bl127-eg-z02mr1.step": height 4.65, standoff 0.05, extent 10.595,-1.6 13.535,1.6
3D body "a-bl127-eg-z02mr1.step": height 4.65, standoff 0.05, extent 13.135,-1.6 16.075,1.6
3D body "a-bl127-eg-z02mr1.step": height 4.65, standoff 0.05, extent 15.675,-1.6 18.615,1.6
3D body "a-bl127-eg-z02mr1.step": height 4.65, standoff 0.05, extent 18.215,-1.6 21.155,1.6
3D body "a-bl127-eg-z02mr1.step": height 4.65, standoff 0.05, extent -2.105,-1.6 0.835,1.6
3D body "a-bl127-eg-z02mr1.step": height 4.65, standoff 0.05, extent 0.435,-1.6 3.375,1.6
3D body "a-bl127-eg-z02mr1.step": height 4.65, standoff 0.05, extent 2.975,-1.6 5.915,1.6
3D body "a-bl127-eg-z02mr1.step": height 4.65, standoff 0.05, extent 5.515,-1.6 8.455,1.6
3D body "a-bl127-eg-z02mr1.step": height 4.65, standoff 0.05, extent -4.645,-1.6 -1.705,1.6
3D body "a-bl127-eg-z02mr1.step": height 4.65, standoff 0.05, extent -7.185,-1.6 -4.245,1.6
3D body "a-bl127-eg-z02mr1.step": height 4.65, standoff 0.05, extent -9.725,-1.6 -6.785,1.6
3D body "a-bl127-eg-z02mr1.step": height 4.65, standoff 0.05, extent -12.265,-1.6 -9.325,1.6
3D body "a-bl127-eg-z02mr1.step": height 4.65, standoff 0.05, extent -14.805,-1.6 -11.865,1.6
3D body "a-bl127-eg-z02mr1.step": height 4.65, standoff 0.05, extent -17.345,-1.6 -14.405,1.6
3D body "a-bl127-eg-z03mr1.stp": height 4.65, standoff 0.05, extent -21.155,-1.6 -16.945,1.6